# Altium footprint library 我的元件库01.PcbLib: 321 footprints (part 5 of 21)
Each footprint in its own frame and in the unit in brackets; x right, y up, seen from the top. Pads: shape width x height; smd on the part's side, far side on the other; paste and mask are expansions set on the pad; w line width, h text height; cw(c..) or ccw(c..) is an arc to the next point about the centre after c.
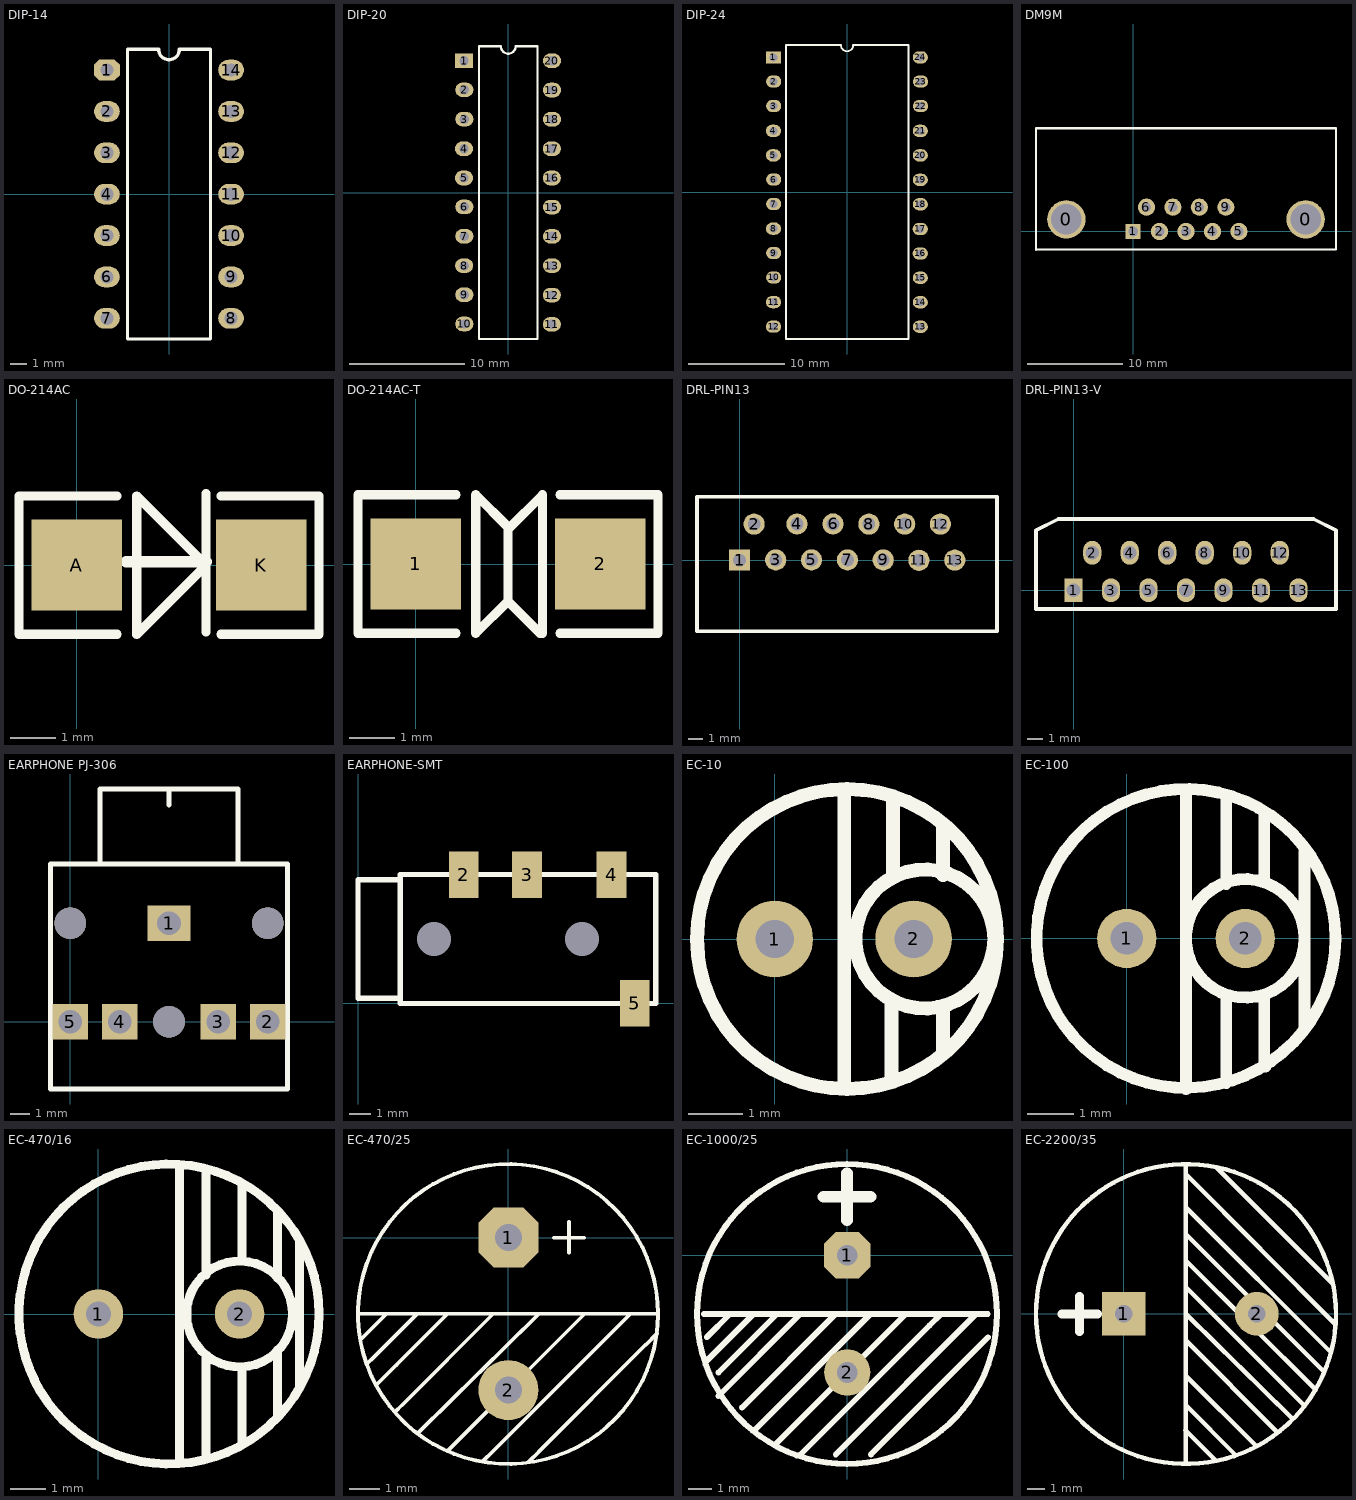
[diagram p4: the footprints below, top view; thin cyan lines are the x and y axes]

## DIP-14 [mil]
pads (14):
  oct 62x50 hole 32: 1(-150,300)
  oval 62x50 hole 32: 2(-150,200) 3(-150,100) 4(-150,0) 5(-150,-100) 6(-150,-200) 7(-150,-300) 8(150,-300) 9(150,-200) 10(150,-100) 11(150,0) 12(150,100) 13(150,200) 14(150,300)
Top Overlay:
  lines w7.87: -100,-350 100,-350 100,350 25,350 cw(c0,350) -25,350 -100,350 -100,-350

## DIP-20 [mil]
pads (20):
  rect 62x50 hole 32: 1(-150.25,449.7)
  oval 62x50 hole 32: 2(-149.25,350.9) 3(-149.25,250.9) 4(-150.25,149.7) 5(-150.25,49.7) 6(-149.25,-49.1) 7(-149.25,-149.1) 8(-149.75,-249.7) 9(-149.25,-349.1) 10(-149.25,-449.1) 11(149.75,-450.3) 12(149.75,-350.3) 13(150.25,-249.7) 14(150.25,-149.7) 15(150.25,-49.7) 16(149.75,49.7) 17(149.75,149.7) 18(150.25,250.3) 19(150.25,350.3) 20(150.25,450.3)
Top Overlay:
  lines w7.87: -99.25,-500.4 -99.25,499.6 -24.25,499.6 ccw(c0.75,499.6) 25.75,499.6 100.75,499.6 100.75,-500.4 -99.25,-500.4

## DIP-24 [mil]
pads (24):
  rect 62x50 hole 32: 1(-300.5,550)
  oval 62x50 hole 32: 2(-299.5,451.2) 3(-299.5,351.2) 4(-300.5,250) 5(-300.5,150) 6(-299.5,51.2) 7(-299.5,-48.8) 8(-300,-149.4) 9(-299.5,-248.8) 10(-299.5,-348.8) 11(-300,-449.4) 12(-300,-549.4) 13(299.5,-550) 14(299.5,-450) 15(299.5,-350) 16(299,-250.6) 17(299,-150.6) 18(299.5,-50) 19(299.5,50) 20(299.5,150) 21(299.5,250) 22(300.5,351.2) 23(300.5,451.2) 24(299.5,550)
Top Overlay:
  lines w7.87: -249.69,-599.95 250.31,-599.95 250.31,600.05 25.31,600.05 cw(c0.31,600.05) -24.69,600.05 -249.69,600.05 -249.69,-599.95

## DM9M [mm]
pads (11):
  round 4 hole 3.2: 0(-6.985,1.27) 0(18.059,1.27)
  rect 1.575x1.575 hole 1: 1(0,0)
  round 1.8 hole 1: 2(2.769,0) 3(5.537,0) 4(8.306,0) 5(11.074,0) 6(1.397,2.54) 7(4.166,2.54) 8(6.934,2.54) 9(9.703,2.54)
Top Overlay:
  lines w0.203: -10.16,-1.905 21.234,-1.905 21.234,10.795
  lines w0.254: -10.16,-1.905 -10.16,10.795 21.234,10.795

## DO-214AC [mm]
pads (2):
  rect 2x2 smd: A(0,0.006) K(4.064,0.006)
Top Overlay:
  lines w0.203: 0.889,-1.518 -1.27,-1.518 -1.27,1.53 0.889,1.53 ; 2.847,-1.465 2.847,1.583 ; 2.847,0.004 1.323,-1.52 1.323,1.528 2.848,0.003 ; 3.175,-1.518 5.334,-1.518 5.334,1.53 3.175,1.53
  lines w0.254: 1.092,0.076 2.847,0.076
3D body "User Library-S1G.STEP": height 2.12, standoff -0.02, extent -0.457,-1.321 4.648,1.346

## DO-214AC-T [mm]
pads (2):
  rect 2x2 smd: 1(0,0.006) 2(4.064,0.006)
Top Overlay:
  lines w0.203: 0.889,-1.518 -1.27,-1.518 -1.27,1.53 0.889,1.53 ; 3.175,-1.518 5.334,-1.518 5.334,1.53 3.175,1.53 ; 2.032,-0.811 2.032,0.387 2.032,0.768 2.794,1.53 2.794,-1.518 2.738,-1.518 2.032,-0.811 ; 2.032,-0.811 2.032,0.819 1.323,1.528 1.323,-1.52 2.032,-0.811
3D body "User Library-S1G.STEP": height 2.12, standoff -0.02, extent -0.452,-1.342 4.654,1.325

## DRL-PIN13 [mm]
pads (13):
  rect 1.5x1.5 hole 0.9: 1(0,0)
  round 1.5 hole 0.9: 2(1.029,2.553) 3(2.561,0.013) 4(4.064,2.559) 5(5.093,0.013) 6(6.617,2.562) 7(7.641,0.013) 8(9.157,2.553) 9(10.173,0.013) 10(11.697,2.553) 11(12.703,-0.009) 12(14.224,2.549) 13(15.24,0)
Top Overlay:
  lines w0.254: 18.223,-5.049 -3.017,-5.049 -3.017,0 -3.017,4.5 18.223,4.5 ; 18.232,-5.041 18.232,-0.009 18.232,4.492

## DRL-PIN13-V [mm]
pads (13):
  rect 1.2x1.6 hole 0.9: 1(0,0)
  oval 1.2x1.6 hole 0.9: 2(1.25,2.5) 3(2.5,0) 4(3.75,2.5) 5(5,0) 6(6.25,2.5) 7(7.5,0) 8(8.75,2.5) 9(10,0) 10(11.25,2.5) 11(12.5,-0.009) 12(13.75,2.5) 13(15,0)
Top Overlay:
  lines w0.254: -2.5,-1.25 17.5,-1.25 17.5,4 16,4.75 -1,4.75 -2.5,4 -2.5,-1.25

## EARPHONE PJ-306 [mm] "PJ-306"
pads (8):
  rect 2.2x1.8 hole 1.2: 1(5,5)
  rect 1.8x1.8 hole 1.2: 2(10,0) 3(7.5,0) 4(2.5,0) 5(0,0)
  round 1.6 hole 1.6 unplated: ""(0,5) ""(5,0) ""(10,5)
Top Overlay:
  lines w0.254: 1.5,8 1.5,11.8 8.4,11.8 ; 5,11 5,11.8 ; 8.5,8 8.5,11.8 ; -1,-3.4 -1,8 11,8 11,-3.4 -1,-3.4
3D body "耳机.STEP": height 3.2, standoff -10.8, extent -1.041,-3.689 11.059,11.411

## EARPHONE-SMT [mm]
pads (6):
  rect 1.4x2.2 smd: 2(4.988,6.101) 3(7.988,6.101) 4(11.988,6.101) 5(13.088,0.001)
  round 1 hole 1.6: ""(3.588,3.051) ""(10.588,3.051)
Top Overlay:
  lines w0.254: 1.988,0.251 -0.012,0.251 -0.012,5.851 1.988,5.851 ; 1.988,0.251 1.988,5.851 ; 1.988,0.251 1.988,0.001 14.088,0.001 14.088,6.101 1.988,6.101 1.988,5.851
3D body "SW3dPS-audio_buchse.STEP": height 4.06, standoff -0.01, extent 0.822,-0.406 12.792,6.928

## EC-10 [mm]
pads (2):
  round 1.4 hole 0.7: 1(0,0) 2(2.54,0)
Top Overlay:
  circle w0.254: c1.321,0 r2.743
  circle w0.254: c2.743,0 r1.27
  lines w0.254: 1.27,-2.7 1.27,2.667 ; 2.134,-2.54 2.134,-1.219 ; 2.159,1.194 2.159,2.565 ; 3.073,-2.032 3.073,-1.33 ; 3.073,1.168 3.073,2.032
3D body "SW3dPS-Cap electro 5x11x2mm.STEP": height 11.53, standoff -3.27, extent -1.23,-2.515 3.821,2.536

## EC-100 [mm]
pads (2):
  round 1.27 hole 0.7: 1(0,0) 2(2.54,0)
Top Overlay:
  circle w0.254: c2.54,0 r1.27
  circle w0.254: c1.27,0 r3.2
  lines w0.254: 1.27,-3.226 1.27,3.175 ; 2.134,-3.099 2.134,-1.245 ; 2.134,1.168 2.134,3.023 ; 2.946,-1.245 2.946,-2.718 2.972,-2.743 ; 2.946,1.219 2.946,2.667 ; 3.81,-1.88 3.81,1.854
3D body "User Library-Cap electro 6_3x12_5x2_5mm.STEP": height 13.03, standoff -3.01, extent -1.981,-3.099 4.37,3.252

## EC-470/16 [mm]
pads (2):
  round 1.4 hole 0.7: 1(0,0) 2(4,0)
Top Overlay:
  circle w0.254: c4,0 r1.5
  circle w0.254: c2,0 r4.25
  lines w0.254: 2.3,-4.2 2.3,4.2 ; 3.048,-4.1 3.048,-1.2 ; 3.048,1.1 3.048,4.1 ; 4.064,-3.7 4.064,-1.524 ; 4.064,1.524 4.064,3.7 ; 5.08,-2.9 5.08,-1.016 ; 5.08,1.016 5.08,2.9 ; 5.7,-2.032 5.7,2.032
3D body "User Library-GXE10VB221MX12LL.STEP": height 12, standoff -19, extent -2.269,-4.191 6.231,4.309

## EC-470/25 [mm]
pads (2):
  oct 2x2 hole 0.9: 1(0,0)
  round 2 hole 0.9: 2(0,-5.08)
Top Overlay:
  circle w0.127: c-0.013,-2.546 r5
  lines w0.127: -5,-2.546 4.886,-2.537 ; -4.928,-3.404 -4.063,-2.539 -4.059,-2.539 ; -4.724,-4.216 -4.571,-4.063 -4.567,-4.063 -3.05,-2.546 ; -4.394,-4.902 -3.738,-4.246 -3.734,-4.246 ; -4.059,-4.571 -2.027,-2.539 ; -3.759,-5.791 -3.555,-5.587 -3.551,-5.587 -0.503,-2.539 ; -3,-6.5 1.021,-2.539 ; -2.027,-7.111 2.545,-2.539 ; -0.864,-7.468 -0.507,-7.111 -0.503,-7.111 3.561,-3.047 4.069,-2.539 ; 0.686,-7.468 1.018,-7.135 1.018,-7.127 4.574,-3.571 4.583,-3.571 4.953,-3.2 ; 1.511,-0.006 2.527,-0.006 ; 2.019,-0.505 2.019,0.519
3D body "User Library-Cap electro 10x16x5_0mm.STEP": height 16.53, standoff -3.74, extent -5.051,-7.62 5,2.431

## EC-1000/25 [mm]
pads (2):
  oct 2x2 hole 0.9: 1(0,0)
  round 2 hole 0.9: 2(0,-5.08)
Top Overlay:
  circle w0.254: c-0.013,-2.546 r6.5
  lines w0.254: -6.213,-2.546 6.088,-2.546 ; -6.091,-4.571 -4.059,-2.539 ; -6.091,-3.555 -5.082,-2.546 -5.075,-2.546 ; -5.583,-6.095 -2.027,-2.539 ; -5.583,-5.079 -3.05,-2.546 -3.043,-2.546 ; -4.567,-6.603 -0.503,-2.539 ; -4.059,-7.619 1.021,-2.539 ; -3.043,-8.127 2.545,-2.539 ; -2.027,-8.635 3.561,-3.047 4.069,-2.539 ; -0.503,-8.635 5.593,-2.539 ; 1.021,-8.635 6.101,-3.555
  lines w0.508: -1.029,2.534 1.003,2.534 ; -0.013,1.518 -0.013,3.55
3D body "User Library-Capacitor, Al El, Thru Mt, 2200uF, 25V - CDE #SEK222M025ST.STEP": height 25.4, standoff -28.75, extent -6.647,-9.169 6.553,4.031

## EC-2200/35 [mm]
pads (2):
  rect 2.5x2.5 hole 1: 1(0,0)
  round 2.5 hole 1: 2(7.62,0)
Top Overlay:
  circle w0.254: c3.562,-0.013 r8.6
  lines w0.254: 3.531,-6.68 5.25,-8.4 ; 3.555,-8.58 3.555,8.55 ; 3.555,-5.583 3.555,-5.075 ; 3.555,-3.551 7.6,-7.6 ; 3.555,-1.519 8.8,-6.8 ; 3.555,0.005 9.65,-6 ; 3.555,2.037 3.555,1.529 10.36,-5.28 ; 3.555,3.053 11,-4.36 ; 3.555,4.577 11.5,-3.35 ; 3.555,6.101 11.87,-2.22 ; 3.556,8.001 12.152,-0.635 ; 3.581,-5.258 6.4,-8.1 ; 5.3,8.4 11.98,1.721
  lines w0.508: -3.55,-0.013 -1.518,-0.013 ; -2.534,-1.029 -2.534,1.003
3D body "User Library-HE Series 18X15.STEP": height 16, standoff -1.5, extent -5.241,-8.966 12.759,9.034